# Altium schematic symbol library IC_TI.SCHLIB: 1162 symbols (part 5 of 8) (continued)
## SN74AHCT08N
designator U?
Integrated Circuit; Manufacturer_Name: Texas Instruments; Manufacturer_Part_Number: SN74AHCT08N; Datasheet Link: http://www.ti.com/lit/gpn/sn74ahct08; Mouser Part Number: 595-SN74AHCT08N; Mouser Price/Stock: https://www.mouser.com/Search/Refine.aspx?Keyword=595-SN74AHCT08N
footprint DIP14
pins: 1 1A, 2 1B, 3 1Y, 4 2A, 5 2B, 6 2Y, 7 GND, 8 3Y, 9 3A, 10 3B, 11 4Y, 12 4A, 13 4B, 14 VCC

## SN74AHCT14D
designator U?
Integrated Circuit; Manufacturer_Name: Texas Instruments; Manufacturer_Part_Number: SN74AHCT14D; Datasheet Link: http://www.ti.com/lit/gpn/sn74ahct14; Mouser Part Number: 595-SN74AHCT14D; Mouser Price/Stock: https://www.mouser.com/Search/Refine.aspx?Keyword=595-SN74AHCT14D; RS Part Number: 6631262; RS Price/Stock: http://uk.rs-online.com/web/p/products/6631262
footprint SOIC14_1.27
pins: 1 1A, 2 1Y, 3 2A, 4 2Y, 5 3A, 6 3Y, 7 GND, 8 4Y, 9 4A, 10 5Y, 11 5A, 12 6Y, 13 6A, 14 VCC

## SN74AHCT32D
designator U?
Integrated Circuit; Manufacturer_Name: Texas Instruments; Manufacturer_Part_Number: SN74AHCT32D; Mouser Part Number: 595-SN74AHCT32D; Mouser Price/Stock: https://www.mouser.com/Search/Refine.aspx?Keyword=595-SN74AHCT32D
footprint SOIC14_1.27
pins: 1 1A, 2 1B, 3 1Y, 4 2A, 5 2B, 6 2Y, 7 GND, 8 3Y, 9 3A, 10 3B, 11 4Y, 12 4A, 13 4B, 14 VCC

## SN74AHCT32N
designator U?
Integrated Circuit; Manufacturer_Name: Texas Instruments; Manufacturer_Part_Number: SN74AHCT32N; Datasheet Link: http://www.ti.com/lit/gpn/sn74ahct32; Mouser Part Number: 595-SN74AHCT32N; Mouser Price/Stock: https://www.mouser.com/Search/Refine.aspx?Keyword=595-SN74AHCT32N
footprint DIP14
pins: 1 1A, 2 1B, 3 1Y, 4 2A, 5 2B, 6 2Y, 7 GND, 8 3Y, 9 3A, 10 3B, 11 4Y, 12 4A, 13 4B, 14 VCC

## SN74AHCT32PW
designator U?
Integrated Circuit; Manufacturer_Name: Texas Instruments; Manufacturer_Part_Number: SN74AHCT32PW; RS Part Number: 6631304; RS Price/Stock: http://uk.rs-online.com/web/p/products/6631304
footprint TSSOP14_0.65 (TSOP, 14-Leads, Body 5.00x4.40mm, Pitch 0.65mm, Thermal Pad 2.31x2.46mm, IPC Low Density)
pins: 1 1A, 2 1B, 3 1Y, 4 2A, 5 2B, 6 2Y, 7 GND, 8 3Y, 9 3A, 10 3B, 11 4Y, 12 4A, 13 4B, 14 VCC

## SN74AHCT74N
designator U?
Integrated Circuit; Manufacturer_Name: Texas Instruments; Manufacturer_Part_Number: SN74AHCT74N; Datasheet Link: http://www.ti.com/lit/gpn/sn74ahct74; Mouser Part Number: 595-SN74AHCT74N; Mouser Price/Stock: https://www.mouser.com/Search/Refine.aspx?Keyword=595-SN74AHCT74N
footprint DIP14
pins: 1 1~CLR, 2 1D, 3 1CLK, 4 1~PRE, 5 1Q, 6 1~Q, 7 GND, 8 2~Q, 9 2Q, 10 2~PRE, 11 2CLK, 12 2D, 13 2~CLR, 14 VCC

## SN74AHCT74PW
designator U?
Integrated Circuit; Manufacturer_Name: Texas Instruments; Manufacturer_Part_Number: SN74AHCT74PW
footprint TSSOP14_0.65 (TSOP, 14-Leads, Body 5.00x4.40mm, Pitch 0.65mm, Thermal Pad 2.31x2.46mm, IPC Low Density)
pins: 1 1~CLR, 2 1D, 3 1CLK, 4 1~PRE, 5 1Q, 6 1~Q, 7 GND, 8 2~Q, 9 2Q, 10 2~PRE, 11 2CLK, 12 2D, 13 2~CLR, 14 VCC

## SN74AHCT125D
designator U?
Integrated Circuit; Manufacturer_Name: Texas Instruments; Manufacturer_Part_Number: SN74AHCT125D; Datasheet Link: http://www.ti.com/lit/ds/symlink/sn74ahct125.pdf; Height: 1.75mm; Mouser Part Number: 595-SN74AHCT125D; Mouser Price/Stock: https://www.mouser.com/Search/Refine.aspx?Keyword=595-SN74AHCT125D; RS Part Number: 6631237P; RS Price/Stock: http://uk.rs-online.com/web/p/products/6631237P
footprint SOIC14_1.27
pins: 1 1~{OE}, 2 1A, 3 1Y, 4 2~{OE}, 5 2A, 6 2Y, 7 GND (power), 8 3Y, 9 3A, 10 3~{OE}, 11 4Y, 12 4A, 13 4~{OE}, 14 VCC (power)

## SN74AHCT125N
designator U?
Integrated Circuit; Manufacturer_Name: Texas Instruments; Manufacturer_Part_Number: SN74AHCT125N; Datasheet Link: http://www.ti.com/lit/gpn/sn74ahct125; Height: 5.08mm; Mouser Part Number: 595-SN74AHCT125N; Mouser Price/Stock: https://www.mouser.com/Search/Refine.aspx?Keyword=595-SN74AHCT125N
footprint DIP14-A
pins: 1 1~{OE}, 2 1A, 3 1Y, 4 2~{OE}, 5 2A, 6 2Y, 7 GND, 8 3Y, 9 3A, 10 3~{OE}, 11 4Y, 12 4A, 13 4~{OE}, 14 VCC

## SN74AHCT126D
designator U?
Integrated Circuit; Manufacturer_Name: Texas Instruments; Manufacturer_Part_Number: SN74AHCT126D
footprint SOIC14_1.27
pins: 1 1OE, 2 1A, 3 1Y, 4 2OE, 5 2A, 6 2Y, 7 GND, 8 3Y, 9 3A, 10 3OE, 11 4Y, 12 4A, 13 4OE, 14 VCC

## SN74AHCT126PW
designator U?
Integrated Circuit; Manufacturer_Name: Texas Instruments; Manufacturer_Part_Number: SN74AHCT126PW; Mouser Part Number: 595-SN74AHCT126PW; Mouser Price/Stock: https://www.mouser.com/Search/Refine.aspx?Keyword=595-SN74AHCT126PW; RS Part Number: 1627313; RS Price/Stock: http://uk.rs-online.com/web/p/products/1627313
footprint TSSOP14_0.65 (TSOP, 14-Leads, Body 5.00x4.40mm, Pitch 0.65mm, Thermal Pad 2.31x2.46mm, IPC Low Density)
pins: 1 1OE, 2 1A, 3 1Y, 4 2OE, 5 2A, 6 2Y, 7 GND, 8 3Y, 9 3A, 10 3OE, 11 4Y, 12 4A, 13 4OE, 14 VCC

## SN74AHCT244DW
designator U?
Integrated Circuit; Manufacturer_Name: Texas Instruments; Manufacturer_Part_Number: SN74AHCT244DW; Mouser Part Number: 595-SN74AHCT244DW; Mouser Price/Stock: https://www.mouser.com/Search/Refine.aspx?Keyword=595-SN74AHCT244DW; RS Part Number: 6631281; RS Price/Stock: http://uk.rs-online.com/web/p/products/6631281
footprint SOIC20W_1.27
pins: 1 1~OE, 2 1A1, 3 2Y4, 4 1A2, 5 2Y3, 6 1A3, 7 2Y2, 8 1A4, 9 2Y1, 10 GND, 11 2A1, 12 1Y4, 13 2A2, 14 1Y3, 15 2A3, 16 1Y2, 17 2A4, 18 1Y1, 19 2~OE, 20 VCC

## SN74AHCT244N
designator U?
Integrated Circuit; Manufacturer_Name: Texas Instruments; Manufacturer_Part_Number: SN74AHCT244N; Datasheet Link: http://www.ti.com/lit/gpn/sn74ahct244; Mouser Part Number: 595-SN74AHCT244N; Mouser Price/Stock: https://www.mouser.com/Search/Refine.aspx?Keyword=595-SN74AHCT244N; RS Part Number: 8072602; RS Price/Stock: http://uk.rs-online.com/web/p/products/8072602
footprint DIP20
pins: 1 1~OE, 2 1A1, 3 2Y4, 4 1A2, 5 2Y3, 6 1A3, 7 2Y2, 8 1A4, 9 2Y1, 10 GND, 11 2A1, 12 1Y4, 13 2A2, 14 1Y3, 15 2A3, 16 1Y2, 17 2A4, 18 1Y1, 19 2~OE, 20 VCC

## SN74AHCT245PWR
designator U?
Integrated Circuit; Manufacturer_Name: Texas Instruments; Manufacturer_Part_Number: SN74AHCT245PWR; Datasheet Link: http://www.ti.com/lit/gpn/sn74ahct245; Height: 1.2mm; Mouser Part Number: 595-SN74AHCT245PWR; Mouser Price/Stock: https://www.mouser.com/Search/Refine.aspx?Keyword=595-SN74AHCT245PWR; RS Part Number: 0527081; RS Price/Stock: http://uk.rs-online.com/web/p/products/0527081
footprint TSSOP20_0.65 (TSOP, 20-Leads, Body 6.6x4.5mm (max), Pitch 0.65mm, IPC Medium Density)
pins: 1 DIR, 2 A1, 3 A2, 4 A3, 5 A4, 6 A5, 7 A6, 8 A7, 9 A8, 10 GND, 11 B8, 12 B7, 13 B6, 14 B5, 15 B4, 16 B3, 17 B2, 18 B1, 19 ~{OE}, 20 VCC

## SN74AHCT541DW
designator U?
Integrated Circuit; Manufacturer_Name: Texas Instruments; Manufacturer_Part_Number: SN74AHCT541DW; Datasheet Link: http://www.ti.com/lit/ds/symlink/sn74ahct541.pdf; Height: 2.65mm; Mouser Part Number: 595-SN74AHCT541DW; Mouser Price/Stock: https://www.mouser.com/Search/Refine.aspx?Keyword=595-SN74AHCT541DW; RS Part Number: 6631310P; RS Price/Stock: http://uk.rs-online.com/web/p/products/6631310P
footprint SOIC20W_1.27
pins: 1 ~{OE1} (in), 2 A1 (in), 3 A2 (in), 4 A3 (in), 5 A4 (in), 6 A5 (in), 7 A6 (in), 8 A7 (in), 9 A8 (in), 10 GND (power), 11 Y8 (out), 12 Y7 (out), 13 Y6 (out), 14 Y5 (out), 15 Y4 (out), 16 Y3 (out), 17 Y2 (out), 18 Y1 (out), 19 ~{OE2} (in), 20 VCC (power)

## SN74AHCT541PW
designator U?
Integrated Circuit; Manufacturer_Name: Texas Instruments; Manufacturer_Part_Number: SN74AHCT541PW; Datasheet Link: http://www.ti.com/lit/gpn/sn74ahct541; Mouser Part Number: 595-SN74AHCT541PW; RS Part Number: 1451072; RS Price/Stock: http://uk.rs-online.com/web/p/products/1451072
footprint TSSOP20_0.65 (TSOP, 20-Leads, Body 6.6x4.5mm (max), Pitch 0.65mm, IPC Medium Density)
pins: 1 ~OE1, 2 A1, 3 A2, 4 A3, 5 A4, 6 A5, 7 A6, 8 A7, 9 A8, 10 GND, 11 Y8, 12 Y7, 13 Y6, 14 Y5, 15 Y4, 16 Y3, 17 Y2, 18 Y1, 19 ~OE2, 20 VCC

## SN74AHCT573DW
designator U?
Integrated Circuit; Manufacturer_Name: Texas Instruments; Manufacturer_Part_Number: SN74AHCT573DW; Datasheet Link: http://www.ti.com/lit/ds/symlink/sn74ahct573.pdf; Height: 2.65mm; Mouser Part Number: 595-SN74AHCT573DW; Mouser Price/Stock: https://www.mouser.com/Search/Refine.aspx?Keyword=595-SN74AHCT573DW; RS Part Number: 6631322; RS Price/Stock: http://uk.rs-online.com/web/p/latches/6631322/?source=DS
footprint SOIC20W_1.27
pins: 1 ~{OE} (in), 2 1D (in), 3 2D (in), 4 3D (in), 5 4D (in), 6 5D (in), 7 6D (in), 8 7D (in), 9 8D (in), 10 GND (power), 11 LE (in), 12 8Q (out), 13 7Q (out), 14 6Q (out), 15 5Q (out), 16 4Q (out), 17 3Q (out), 18 2Q (out), 19 1Q (out), 20 VCC (power)

## SN74AHCT573N
designator U?
Integrated Circuit; Manufacturer_Name: Texas Instruments; Manufacturer_Part_Number: SN74AHCT573N; Datasheet Link: http://www.ti.com/lit/gpn/sn74ahct573; Mouser Part Number: 595-SN74AHCT573N; Mouser Price/Stock: https://www.mouser.com/Search/Refine.aspx?Keyword=595-SN74AHCT573N; RS Part Number: 6631326P; RS Price/Stock: http://uk.rs-online.com/web/p/products/6631326P
footprint DIP20
pins: 1 ~OE, 2 1D, 3 2D, 4 3D, 5 4D, 6 5D, 7 6D, 8 7D, 9 8D, 10 GND, 11 LE, 12 8Q, 13 7Q, 14 6Q, 15 5Q, 16 4Q, 17 3Q, 18 2Q, 19 1Q, 20 VCC

## SN74ALVC245PWR
designator U?
Integrated Circuit; Manufacturer_Name: Texas Instruments; Manufacturer_Part_Number: SN74ALVC245PWR; Datasheet Link: http://www.ti.com/lit/gpn/sn74alvc245; Height: 1.2mm; Mouser Part Number: 595-SN74ALVC245PWR; Mouser Price/Stock: https://www.mouser.com/Search/ProductDetail.aspx?qs=gqbMQSs93zP5WPyS7nwhig%3d%3d
footprint TSSOP20_0.65 (TSOP, 20-Leads, Body 6.6x4.5mm (max), Pitch 0.65mm, IPC Medium Density)
pins: 1 DIR, 2 A1, 3 A2, 4 A3, 5 A4, 6 A5, 7 A6, 8 A7, 9 A8, 10 GND, 11 B8, 12 B7, 13 B6, 14 B5, 15 B4, 16 B3, 17 B2, 18 B1, 19 ~{OE}, 20 VCC

## SN74ALVC164245DGGR
designator U?
Integrated Circuit; Manufacturer_Name: Texas Instruments; Manufacturer_Part_Number: SN74ALVC164245DGGR; Datasheet Link: http://www.ti.com/lit/gpn/sn74alvc164245; Height: 1.2mm; Mouser Part Number: 595-SNALVC164245DGGR; Mouser Price/Stock: https://www.mouser.com/Search/Refine.aspx?Keyword=595-SNALVC164245DGGR; RS Part Number: 3972683; RS Price/Stock: http://uk.rs-online.com/web/p/products/3972683
footprint TSSOP48_0.5 (Footprint not found)
pins: 1 1DIR, 2 1B1, 3 1B2, 4 GND_1, 5 1B3, 6 1B4, 7 VCCB_(3.3_V,_5_V)_1, 8 1B5, 9 1B6, 10 GND_2, 11 1B7, 12 1B8, 13 2B1, 14 2B2, 15 GND_3, 16 2B3, 17 2B4, 18 VCCB_(3.3_V,_5_V)_2, 19 2B5, 20 2B6, 21 GND_4, 22 2B7, 23 2B8, 24 2DIR, 25 2~{OE}, 26 2A8, 27 2A7, 28 GND_5, 29 2A6, 30 2A5, 31 VCCA_(2.5_V,_3.3_V)_1, 32 2A4, 33 2A3, 34 GND_6, 35 2A2, 36 2A1, 37 1A8, 38 1A7, 39 GND_7, 40 1A6, 41 1A5, 42 VCCA_(2.5_V,_3.3_V)_2, 43 1A4, 44 1A3, 45 GND_8, 46 1A2, 47 1A1, 48 1~{OE}

## SN74AVC2T45DCTR
designator U?
Integrated Circuit; Manufacturer_Name: Texas Instruments; Manufacturer_Part_Number: SN74AVC2T45DCTR; Datasheet Link: http://www.ti.com/lit/ds/symlink/sn74avc2t45.pdf; Height: 1.3mm; Mouser Part Number: 595-SN74AVC2T45DCTR; Mouser Price/Stock: https://www.mouser.com/Search/Refine.aspx?Keyword=595-SN74AVC2T45DCTR; RS Part Number: 1684366; RS Price/Stock: http://uk.rs-online.com/web/p/products/1684366
footprint VSSOP8_0.65(4X3)
pins: 1 VCCA (power), 2 A1, 3 A2, 4 GND (power), 5 DIR, 6 B2, 7 B1, 8 VCCB (power)

## SN74AVC2T45DCUR
designator U?
Integrated Circuit; Manufacturer_Name: Texas Instruments; Manufacturer_Part_Number: SN74AVC2T45DCUR; Datasheet Link: http://www.ti.com/lit/gpn/sn74avc2t45; Mouser Part Number: 595-SN74AVC2T45DCUR; Mouser Price/Stock: https://www.mouser.com/Search/Refine.aspx?Keyword=595-SN74AVC2T45DCUR; RS Part Number: 9222820; RS Price/Stock: http://uk.rs-online.com/web/p/products/9222820
footprint VSSOP8_0.5(3X2)
pins: 1 VCCA, 2 A1, 3 A2, 4 GND, 5 DIR, 6 B2, 7 B1, 8 VCCB

## SN74AVC2T245RSWR
designator U?
Integrated Circuit; Manufacturer_Name: Texas Instruments; Datasheet Link: http://www.ti.com/lit/ds/symlink/sn74avc2t245.pdf; Manufacturer_Part_Number: SN74AVC2T245RSWR; Mouser Part Number: 595-SN74AVC2T245RSWR; Mouser Price/Stock: https://www.mouser.com/Search/Refine.aspx?Keyword=595-SN74AVC2T245RSWR; RS Part Number: 8143880P; RS Price/Stock: http://uk.rs-online.com/web/p/products/8143880P
footprint QFN10_0.5-PAD(1.5X2)
pins: 1 DIR2, 2 ~{OE2}, 3 GND (power), 4 B2, 5 B1, 6 VCCB (power), 7 VCCA (power), 8 A1, 9 A2, 10 DIR1

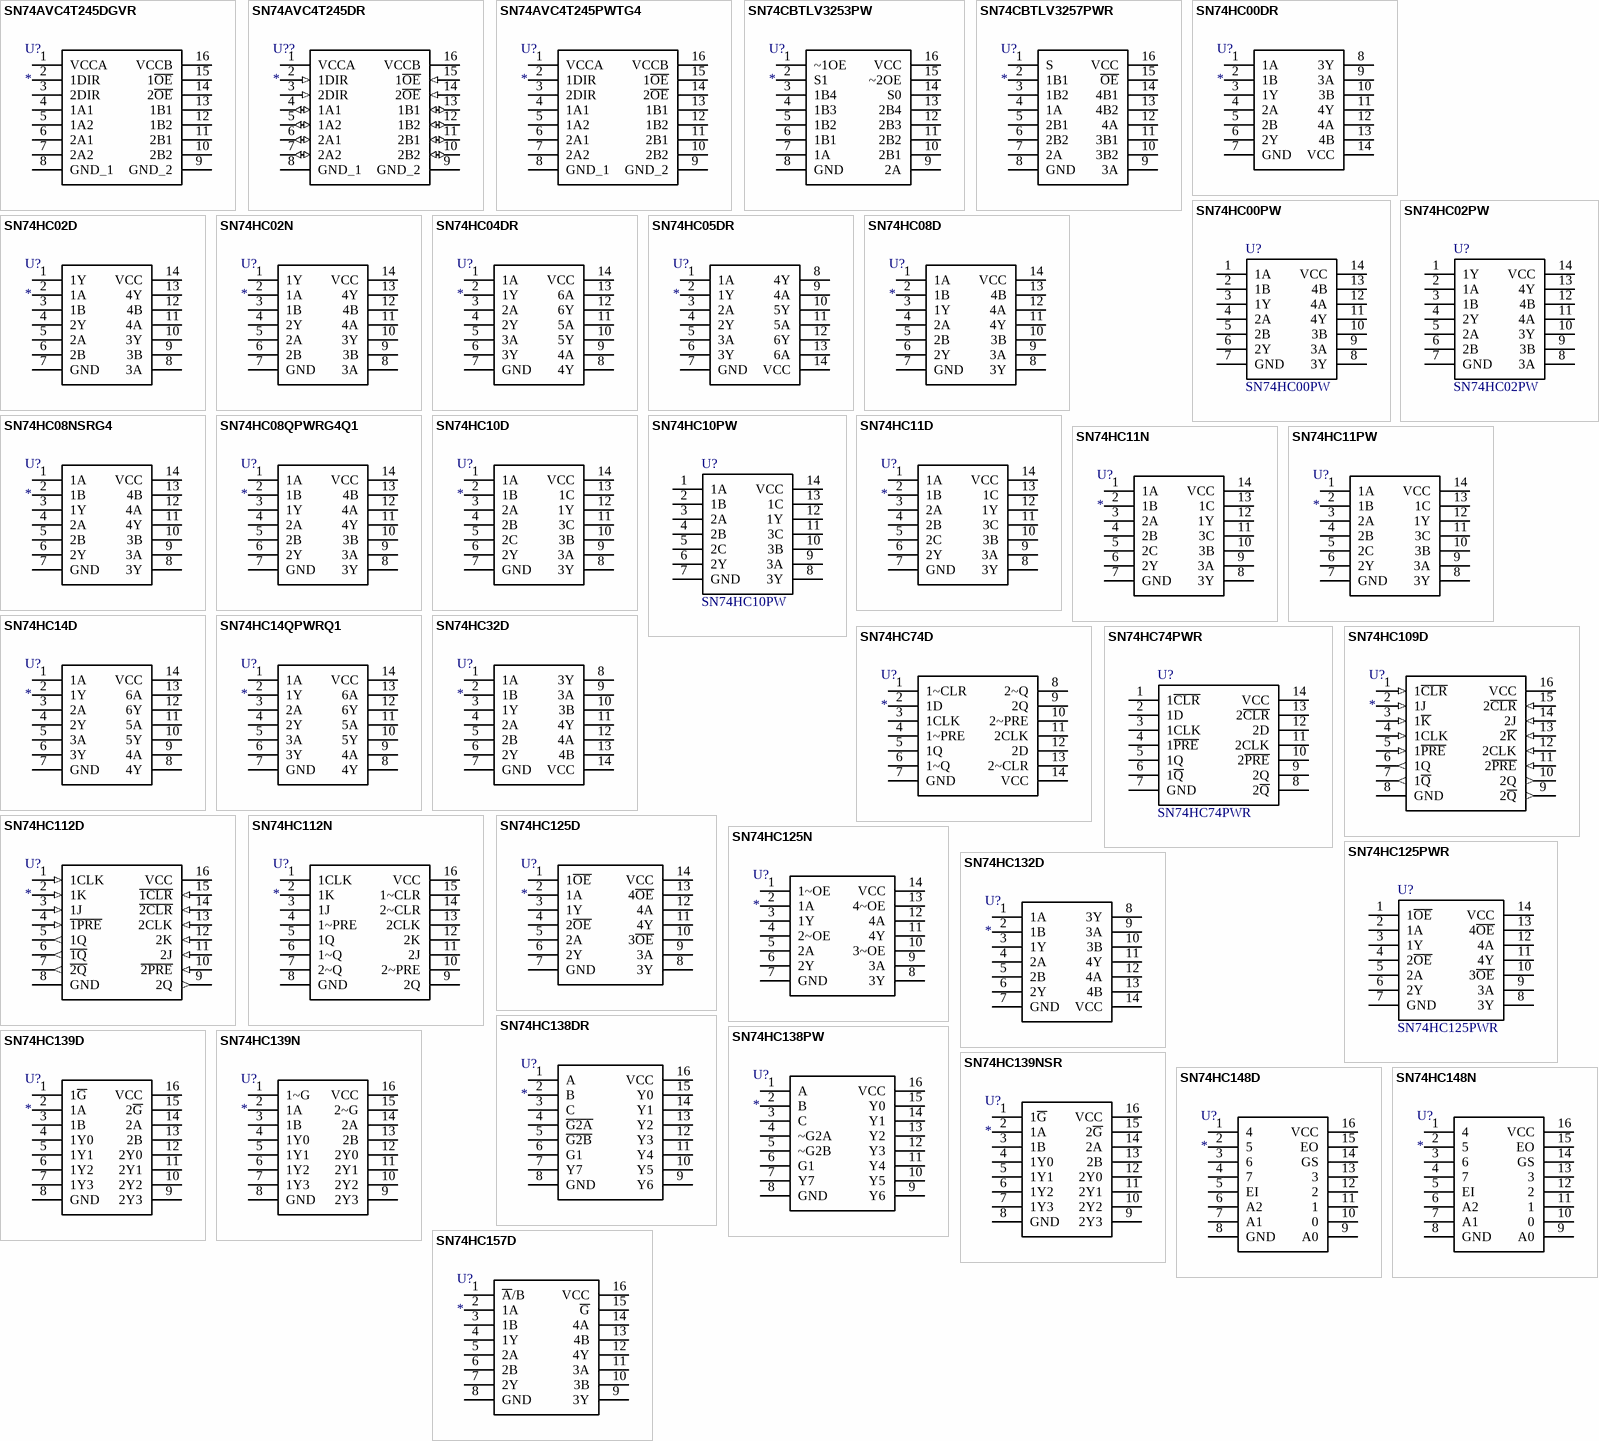
[diagram p20: symbols SN74AVC4T245DGVR to SN74HC157D]

## SN74AVC4T245DGVR
designator U?
Integrated Circuit; Manufacturer_Name: Texas Instruments; Manufacturer_Part_Number: SN74AVC4T245DGVR; Datasheet Link: http://www.ti.com/lit/gpn/sn74avc4t245; Height: 1.2mm; Mouser Part Number: 595-SN74AVC4T245DGVR; Mouser Price/Stock: https://www.mouser.com/Search/Refine.aspx?Keyword=595-SN74AVC4T245DGVR; RS Part Number: 1628699; RS Price/Stock: http://uk.rs-online.com/web/p/products/1628699
footprint VSSOP16_0.4(6.4X3.6)
pins: 1 VCCA, 2 1DIR, 3 2DIR, 4 1A1, 5 1A2, 6 2A1, 7 2A2, 8 GND_1, 9 GND_2, 10 2B2, 11 2B1, 12 1B2, 13 1B1, 14 2~{OE}, 15 1~{OE}, 16 VCCB

## SN74AVC4T245DR
designator U??
Undefined or Miscellaneous; Manufacturer_Name: Texas Instruments; Manufacturer_Part_Number: SN74AVC4T245DR; Datasheet Link: http://www.ti.com/lit/gpn/sn74avc4t245; Height: 1.75mm; Mouser Part Number: 595-SN74AVC4T245DR; Mouser Price/Stock: https://www.mouser.com/Search/Refine.aspx?Keyword=595-SN74AVC4T245DR; RS Part Number: 1627358; RS Price/Stock: http://uk.rs-online.com/web/p/products/1627358
footprint SOIC16_1.27
pins: 1 VCCA (power), 2 1DIR (in), 3 2DIR (in), 4 1A1 (io), 5 1A2 (io), 6 2A1 (io), 7 2A2 (io), 8 GND_1 (power), 9 GND_2 (power), 10 2B2 (io), 11 2B1 (io), 12 1B2 (io), 13 1B1 (io), 14 2~{OE} (in), 15 1~{OE} (in), 16 VCCB (power)

## SN74AVC4T245PWTG4
designator U?
Integrated Circuit; Manufacturer_Name: Texas Instruments; Manufacturer_Part_Number: SN74AVC4T245PWTG4; Datasheet Link: http://www.ti.com/lit/ds/symlink/sn74avc4t245.pdf; Height: 1.2mm; Mouser Part Number: 595-74AVC4T245PWTG4; Mouser Price/Stock: https://www.mouser.com/Search/Refine.aspx?Keyword=595-74AVC4T245PWTG4
footprint TSSOP16_0.65 (Shrink Small Outline; 16 Leads; Body Width 4.4 mm; Pitch 0.65 mm)
pins: 1 VCCA, 2 1DIR, 3 2DIR, 4 1A1, 5 1A2, 6 2A1, 7 2A2, 8 GND_1, 9 GND_2, 10 2B2, 11 2B1, 12 1B2, 13 1B1, 14 2~{OE}, 15 1~{OE}, 16 VCCB

## SN74CBTLV3253PW
designator U?
Integrated Circuit; Manufacturer_Name: Texas Instruments; Manufacturer_Part_Number: SN74CBTLV3253PW; Mouser Part Number: 595-SN74CBTLV3253PW; Mouser Price/Stock: https://www.mouser.com/Search/Refine.aspx?Keyword=595-SN74CBTLV3253PW; RS Part Number: 6631770P; RS Price/Stock: http://uk.rs-online.com/web/p/products/6631770P
footprint TSSOP16_0.65 (Shrink Small Outline; 16 Leads; Body Width 4.4 mm; Pitch 0.65 mm)
pins: 1 ~1OE, 2 S1, 3 1B4, 4 1B3, 5 1B2, 6 1B1, 7 1A, 8 GND, 9 2A, 10 2B1, 11 2B2, 12 2B3, 13 2B4, 14 S0, 15 ~2OE, 16 VCC

## SN74CBTLV3257PWR
designator U?
Integrated Circuit; Manufacturer_Name: Texas Instruments; Manufacturer_Part_Number: SN74CBTLV3257PWR; Datasheet Link: http://www.ti.com/lit/ds/symlink/sn74cbtlv3257.pdf; Height: 1.2mm; Mouser Part Number: 595-SN74CBTLV3257PWR; Mouser Price/Stock: https://www.mouser.com/Search/Refine.aspx?Keyword=595-SN74CBTLV3257PWR; RS Part Number: 2509628755; RS Price/Stock: http://uk.rs-online.com/web/p/products/2509628755
footprint TSSOP16_0.65 (Shrink Small Outline; 16 Leads; Body Width 4.4 mm; Pitch 0.65 mm)
pins: 1 S, 2 1B1, 3 1B2, 4 1A, 5 2B1, 6 2B2, 7 2A, 8 GND (power), 9 3A, 10 3B2, 11 3B1, 12 4A, 13 4B2, 14 4B1, 15 ~{OE}, 16 VCC (power)

## SN74HC00DR
designator U?
Integrated Circuit; Manufacturer_Name: Texas Instruments; Manufacturer_Part_Number: SN74HC00DR; Datasheet Link: http://componentsearchengine.com/Datasheets/3/SN74HC00DR.pdf; Mouser Part Number: 595-SN74HC00DR; Mouser Price/Stock: https://www.mouser.com/Search/Refine.aspx?Keyword=595-SN74HC00DR; RS Part Number: 1684861; RS Price/Stock: http://uk.rs-online.com/web/p/products/1684861
footprint SOIC14_1.27
pins: 1 1A, 2 1B, 3 1Y, 4 2A, 5 2B, 6 2Y, 7 GND, 8 3Y, 9 3A, 10 3B, 11 4Y, 12 4A, 13 4B, 14 VCC

## SN74HC00PW
designator U?
Integrated Circuit; Manufacturer_Name: Texas Instruments; Manufacturer_Part_Number: SN74HC00PW; Mouser Part Number: 595-SN74HC00PW; Mouser Price/Stock: https://www.mouser.com/Search/Refine.aspx?Keyword=595-SN74HC00PW; RS Part Number: 1450449; RS Price/Stock: http://uk.rs-online.com/web/p/products/1450449
footprint TSSOP14_0.65 (TSOP, 14-Leads, Body 5.00x4.40mm, Pitch 0.65mm, Thermal Pad 2.31x2.46mm, IPC Low Density)
pins: 1 1A, 2 1B, 3 1Y, 4 2A, 5 2B, 6 2Y, 7 GND, 8 3Y, 9 3A, 10 3B, 11 4Y, 12 4A, 13 4B, 14 VCC

## SN74HC02D
designator U?
Integrated Circuit; Manufacturer_Name: Texas Instruments; Manufacturer_Part_Number: SN74HC02D; Datasheet Link: http://www.ti.com/lit/ds/symlink/sn74hc02.pdf; Height: 1.75mm; Mouser Part Number: 595-SN74HC02D; Mouser Price/Stock: https://www.mouser.com/Search/Refine.aspx?Keyword=595-SN74HC02D; RS Part Number: 6631874P; RS Price/Stock: http://uk.rs-online.com/web/p/products/6631874P
footprint SOIC14_1.27
pins: 1 1Y, 2 1A, 3 1B, 4 2Y, 5 2A, 6 2B, 7 GND (power), 8 3A, 9 3B, 10 3Y, 11 4A, 12 4B, 13 4Y, 14 VCC (power)

## SN74HC02N
designator U?
Integrated Circuit; Manufacturer_Name: Texas Instruments; Manufacturer_Part_Number: SN74HC02N; Datasheet Link: http://componentsearchengine.com/Datasheets/3/SN74HC02N.pdf; Mouser Part Number: 595-SN74HC02N; Mouser Price/Stock: https://www.mouser.com/Search/Refine.aspx?Keyword=595-SN74HC02N; RS Part Number: 3332754; RS Price/Stock: http://uk.rs-online.com/web/p/products/3332754
footprint DIP14
pins: 1 1Y, 2 1A, 3 1B, 4 2Y, 5 2A, 6 2B, 7 GND, 8 3A, 9 3B, 10 3Y, 11 4A, 12 4B, 13 4Y, 14 VCC

## SN74HC02PW
designator U?
Integrated Circuit; Manufacturer_Name: Texas Instruments; Manufacturer_Part_Number: SN74HC02PW; Mouser Part Number: 595-SN74HC02PW; Mouser Price/Stock: https://www.mouser.com/Search/Refine.aspx?Keyword=595-SN74HC02PW; RS Part Number: 1450710; RS Price/Stock: http://uk.rs-online.com/web/p/products/1450710
footprint TSSOP14_0.65 (TSOP, 14-Leads, Body 5.00x4.40mm, Pitch 0.65mm, Thermal Pad 2.31x2.46mm, IPC Low Density)
pins: 1 1Y, 2 1A, 3 1B, 4 2Y, 5 2A, 6 2B, 7 GND, 8 3A, 9 3B, 10 3Y, 11 4A, 12 4B, 13 4Y, 14 VCC

## SN74HC04DR
designator U?
Integrated Circuit; Manufacturer_Name: Texas Instruments; Manufacturer_Part_Number: SN74HC04DR; Datasheet Link: http://www.ti.com/lit/ds/symlink/sn74hc04.pdf; Height: 1.75mm; Mouser Part Number: 595-SN74HC04DR; Mouser Price/Stock: https://www.mouser.com/Search/Refine.aspx?Keyword=595-SN74HC04DR; RS Part Number: 0527558; RS Price/Stock: http://uk.rs-online.com/web/p/products/0527558
footprint SOIC14_1.27
pins: 1 1A, 2 1Y, 3 2A, 4 2Y, 5 3A, 6 3Y, 7 GND (power), 8 4Y, 9 4A, 10 5Y, 11 5A, 12 6Y, 13 6A, 14 VCC (power)

## SN74HC05DR
designator U?
Integrated Circuit; Manufacturer_Name: Texas Instruments; Manufacturer_Part_Number: SN74HC05DR; Datasheet Link: http://www.ti.com/lit/gpn/sn74hc05; Mouser Part Number: 595-SN74HC05DR; Mouser Price/Stock: https://www.mouser.com/Search/Refine.aspx?Keyword=595-SN74HC05DR
footprint SOIC14_1.27
pins: 1 1A, 2 1Y, 3 2A, 4 2Y, 5 3A, 6 3Y, 7 GND, 8 4Y, 9 4A, 10 5Y, 11 5A, 12 6Y, 13 6A, 14 VCC

## SN74HC08D
designator U?
Integrated Circuit; Manufacturer_Name: Texas Instruments; Manufacturer_Part_Number: SN74HC08D; Datasheet Link: http://docs-emea.rs-online.com/webdocs/0b80/0900766b80b80bbb.pdf; Height: 1.75mm; Mouser Part Number: 595-SN74HC08D; Mouser Price/Stock: https://www.mouser.com/Search/Refine.aspx?Keyword=595-SN74HC08D; RS Part Number: 2508244337; RS Price/Stock: http://uk.rs-online.com/web/p/products/2508244337
footprint SOIC14_1.27
pins: 1 1A, 2 1B, 3 1Y, 4 2A, 5 2B, 6 2Y, 7 GND (power), 8 3Y, 9 3A, 10 3B, 11 4Y, 12 4A, 13 4B, 14 VCC (power)

## SN74HC08NSRG4
designator U?
Integrated Circuit; Manufacturer_Name: Texas Instruments; Manufacturer_Part_Number: SN74HC08NSRG4; Datasheet Link: http://www.ti.com/lit/ds/symlink/sn74hc08.pdf; Height: 2mm; Mouser Part Number: 595-SN74HC08NSRG4; Mouser Price/Stock: https://www.mouser.com/Search/Refine.aspx?Keyword=595-SN74HC08NSRG4
footprint SOP14W_1.27
pins: 1 1A, 2 1B, 3 1Y, 4 2A, 5 2B, 6 2Y, 7 GND, 8 3Y, 9 3A, 10 3B, 11 4Y, 12 4A, 13 4B, 14 VCC

## SN74HC08QPWRG4Q1
designator U?
Integrated Circuit; Manufacturer_Name: Texas Instruments; Manufacturer_Part_Number: SN74HC08QPWRG4Q1; Datasheet Link: http://www.ti.com/lit/gpn/sn74hc08-q1; Height: 1.2mm; Mouser Part Number: 595-SN74HC08QPWRG4Q1; Mouser Price/Stock: https://www.mouser.com/Search/Refine.aspx?Keyword=595-SN74HC08QPWRG4Q1
footprint TSSOP14_0.65 (TSOP, 14-Leads, Body 5.00x4.40mm, Pitch 0.65mm, Thermal Pad 2.31x2.46mm, IPC Low Density)
pins: 1 1A, 2 1B, 3 1Y, 4 2A, 5 2B, 6 2Y, 7 GND, 8 3Y, 9 3A, 10 3B, 11 4Y, 12 4A, 13 4B, 14 VCC

## SN74HC10D
designator U?
Integrated Circuit; Manufacturer_Name: Texas Instruments; Manufacturer_Part_Number: SN74HC10D; Datasheet Link: http://www.ti.com/lit/ds/symlink/sn74hc10.pdf; Height: 1.75mm; Mouser Part Number: 595-SN74HC10D; Mouser Price/Stock: https://www.mouser.com/Search/Refine.aspx?Keyword=595-SN74HC10D; RS Part Number: 6631896P; RS Price/Stock: http://uk.rs-online.com/web/p/products/6631896P
footprint SOIC14_1.27
pins: 1 1A, 2 1B, 3 2A, 4 2B, 5 2C, 6 2Y, 7 GND (power), 8 3Y, 9 3A, 10 3B, 11 3C, 12 1Y, 13 1C, 14 VCC (power)

## SN74HC10PW
designator U?
Integrated Circuit; Manufacturer_Name: Texas Instruments; Datasheet Link: http://componentsearchengine.com/Datasheets/1/SN74HC10PW.pdf; Manufacturer_Part_Number: SN74HC10PW; Mouser Part Number: 595-SN74HC10PW; Mouser Price/Stock: https://www.mouser.com/Search/Refine.aspx?Keyword=595-SN74HC10PW
footprint TSSOP14_0.65 (TSOP, 14-Leads, Body 5.00x4.40mm, Pitch 0.65mm, Thermal Pad 2.31x2.46mm, IPC Low Density)
pins: 1 1A, 2 1B, 3 2A, 4 2B, 5 2C, 6 2Y, 7 GND, 8 3Y, 9 3A, 10 3B, 11 3C, 12 1Y, 13 1C, 14 VCC

## SN74HC11D
designator U?
Integrated Circuit; Manufacturer_Name: Texas Instruments; Manufacturer_Part_Number: SN74HC11D; Datasheet Link: http://www.ti.com/lit/ds/symlink/sn74hc11.pdf; Height: 1.75mm; Mouser Part Number: 595-SN74HC11D; Mouser Price/Stock: https://www.mouser.com/Search/Refine.aspx?Keyword=595-SN74HC11D; RS Part Number: 6631903; RS Price/Stock: http://uk.rs-online.com/web/p/products/6631903
footprint SOIC14_1.27
pins: 1 1A, 2 1B, 3 2A, 4 2B, 5 2C, 6 2Y, 7 GND (power), 8 3Y, 9 3A, 10 3B, 11 3C, 12 1Y, 13 1C, 14 VCC (power)

## SN74HC11N
designator U?
Integrated Circuit; Manufacturer_Name: Texas Instruments; Manufacturer_Part_Number: SN74HC11N; Datasheet Link: http://componentsearchengine.com/Datasheets/1/SN74HC11N.pdf; Mouser Part Number: 595-SN74HC11N; Mouser Price/Stock: https://www.mouser.com/Search/Refine.aspx?Keyword=595-SN74HC11N; RS Part Number: 0526177; RS Price/Stock: http://uk.rs-online.com/web/p/products/0526177
footprint DIP14
pins: 1 1A, 2 1B, 3 2A, 4 2B, 5 2C, 6 2Y, 7 GND, 8 3Y, 9 3A, 10 3B, 11 3C, 12 1Y, 13 1C, 14 VCC

## SN74HC11PW
designator U?
Integrated Circuit; Manufacturer_Name: Texas Instruments; Manufacturer_Part_Number: SN74HC11PW; Datasheet Link: http://componentsearchengine.com/Datasheets/1/SN74HC11PW.pdf; Mouser Part Number: 595-SN74HC11PW; Mouser Price/Stock: https://www.mouser.com/Search/Refine.aspx?Keyword=595-SN74HC11PW
footprint TSSOP14_0.65 (TSOP, 14-Leads, Body 5.00x4.40mm, Pitch 0.65mm, Thermal Pad 2.31x2.46mm, IPC Low Density)
pins: 1 1A, 2 1B, 3 2A, 4 2B, 5 2C, 6 2Y, 7 GND, 8 3Y, 9 3A, 10 3B, 11 3C, 12 1Y, 13 1C, 14 VCC